# Altium footprint library THU.PcbLib: 477 footprints (part 2 of 30)
Each footprint in its own frame and in the unit in brackets; x right, y up, seen from the top. Pads: shape width x height; smd on the part's side, far side on the other; paste and mask are expansions set on the pad; w line width, h text height; cw(c..) or ccw(c..) is an arc to the next point about the centre after c.
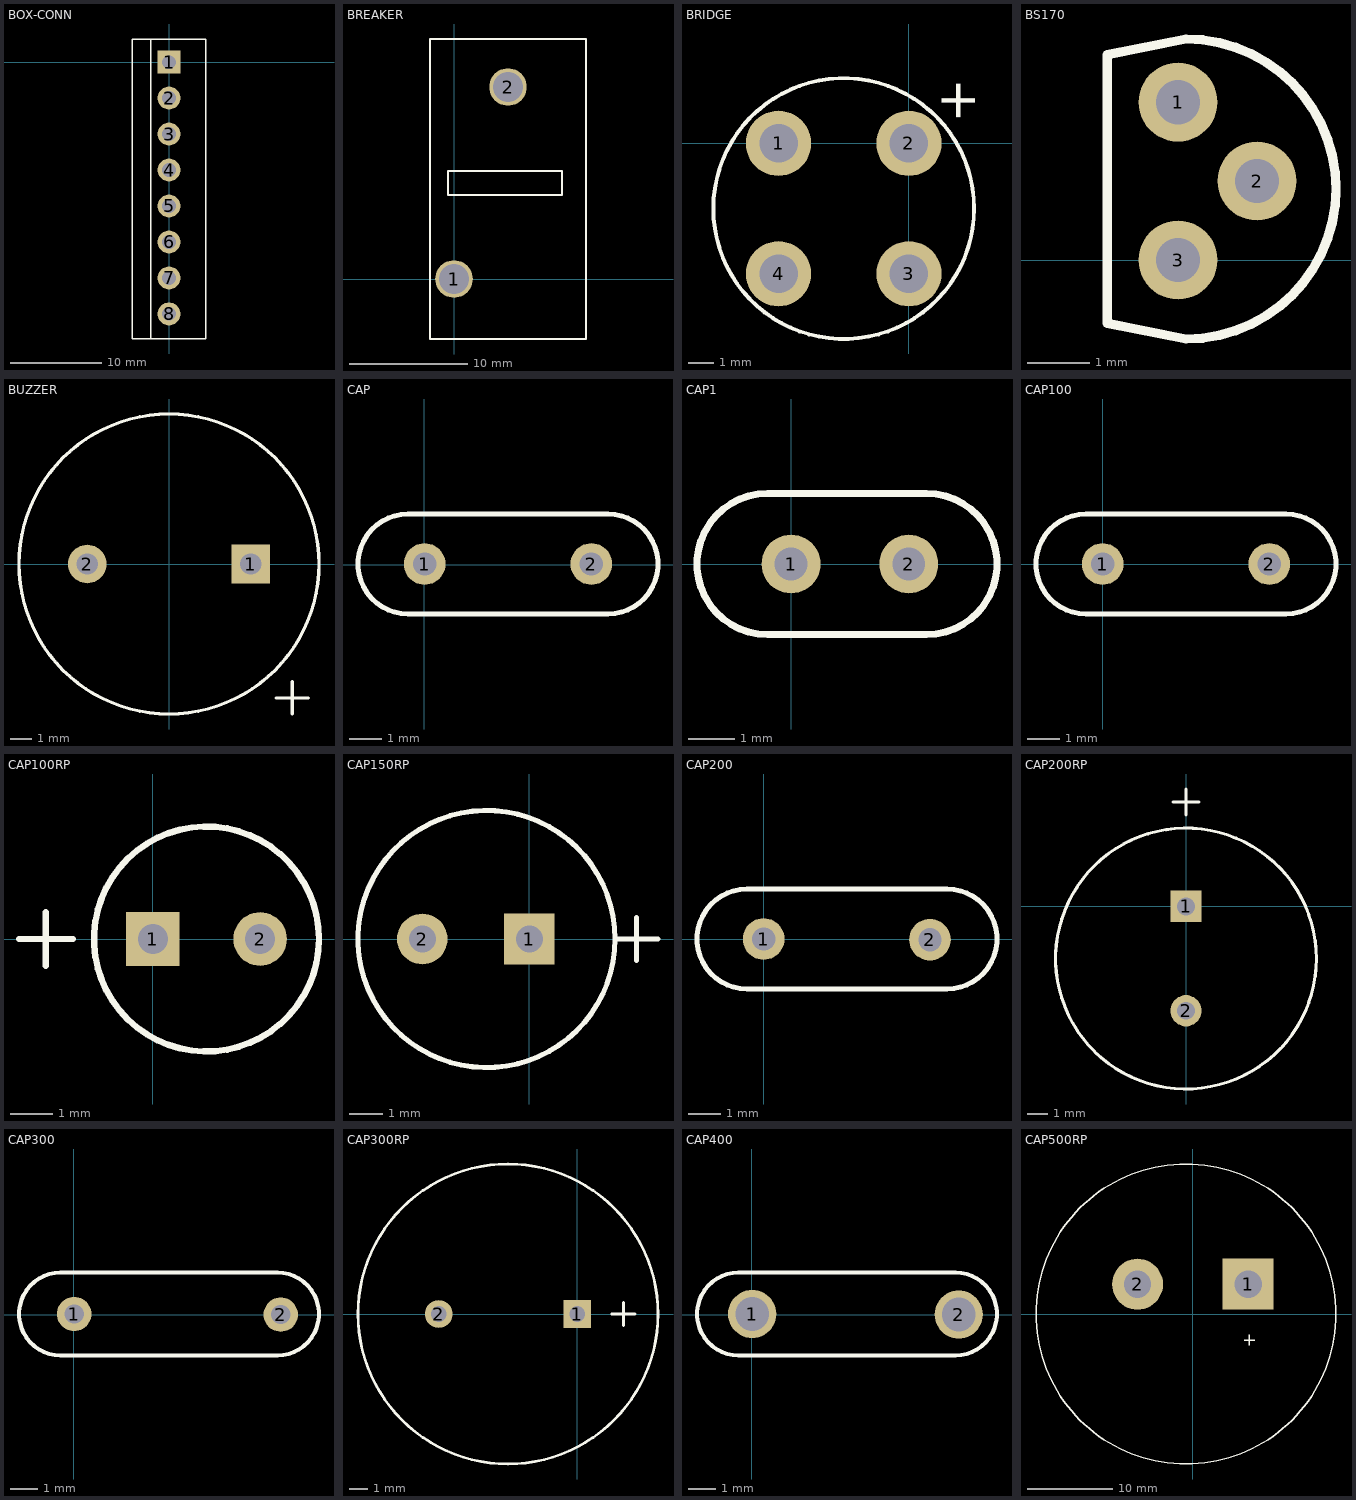
[diagram p1: the footprints below, top view; thin cyan lines are the x and y axes]

## BOX-CONN [mil]
pads (8):
  rect 100x100 hole 59: 1(0,0)
  round 100 hole 59: 2(0,-155.91) 3(0,-311.81) 4(0,-467.72) 5(0,-623.62) 6(0,-779.53) 7(0,-935.43) 8(0,-1091.34)
TopOverlay:
  lines w6: -80,-1200 -80,100 ; -160,-1200 160,-1200 160,100 -160,100 -160,-1200

## BREAKER [mil]
pads (2):
  round 125 hole 100: 1(0,0) 2(180,640)
TopOverlay:
  lines w6: -80,-200 440,-200 440,800 -80,800 -80,-200 ; -20,280 360,280 360,360 -20,360 -20,280

## BRIDGE [mil]
pads (4):
  round 100 hole 59: 1(-200,0) 2(0,0) 3(0,-200) 4(-200,-200)
TopOverlay:
  circle w6: c-100,-100 r200
  text "+" at 50,100 h60

## BS170 [mil]
pads (3):
  round 50 hole 28: 1(-120.08,100) 2(-70.08,50) 3(-120.08,0)
TopOverlay:
  lines w6: -165.08,-40 -115.08,-50 ccw(c-115.08,45) -115.08,140 -165.08,130 -165.08,-40

## BUZZER [mm] "TRANSDUCER/BUZZER"
height 7.45
pads (2):
  rect 1.8x1.8 hole 1: 1(3.81,0)
  round 1.8 hole 1: 2(-3.81,0)
TopOverlay:
  circle w0.152: c0,0 r7
  lines w0.152: 5,-6.25 6.5,-6.25 ; 5.75,-7 5.75,-5.5

## CAP [mil]
pads (2):
  round 50 hole 28: 1(0.5,0.81) 2(200.5,0.81)
TopOverlay:
  lines w6: -19.5,-59.19 cw(c-19.5,0.81) -19.5,60.81 220.5,60.81 cw(c220.5,0.81) 220.5,-59.19 -19.5,-59.19

## CAP1 [mil]
pads (2):
  round 50 hole 28: 1(0,0) 2(100,0)
TopOverlay:
  lines w6: -20,-60 cw(c-20,0) -20,60 115,60 cw(c115,0) 115,-60 -20,-60

## CAP100 [mil]
pads (2):
  round 50 hole 28: 1(0,0) 2(200,0)
TopOverlay:
  lines w6: -20,-60 cw(c-20,0) -20,60 220,60 cw(c220,0) 220,-60 -20,-60

## CAP100RP [mil]
pads (2):
  rect 50x50 hole 28: 1(0,0)
  round 50 hole 28: 2(100,0)
TopOverlay:
  circle w6: c50,0 r105
  lines w6: -125,0 -75,0 ; -100,-25 -100,25

## CAP150RP [mm]
pads (2):
  rect 1.5x1.5 hole 0.8: 1(0,0)
  round 1.5 hole 0.8: 2(-3.175,0)
TopOverlay:
  circle w0.152: c-1.27,0 r3.81
  lines w0.152: 2.54,0 3.81,0 ; 3.175,-0.635 3.175,0.635

## CAP200 [mil]
pads (2):
  round 50 hole 28: 1(0,0) 2(199.5,-0.81)
TopOverlay:
  lines w6: -20,-60 cw(c-20,0) -20,60 220,60 cw(c220,0) 220,-60 -20,-60

## CAP200RP [mil]
pads (2):
  rect 60x60 hole 34: 1(0,0)
  round 60 hole 34: 2(0,-200)
TopOverlay:
  circle w6: c0,-100 r250
  lines w6: -25,200 25,200 ; 0,175 0,225

## CAP300 [mil]
pads (2):
  round 50 hole 28: 1(0.5,0.81) 2(300,0)
TopOverlay:
  lines w6: -19.5,-59.19 cw(c-19.5,0.81) -19.5,60.81 295.5,60.81 cw(c295.5,0.81) 295.5,-59.19 -19.5,-59.19

## CAP300RP [mil]
pads (2):
  rect 60x60 hole 34: 1(0,0)
  round 60 hole 34: 2(-300,0)
TopOverlay:
  circle w6: c-150,0 r325
  lines w6: 75,0 125,0 ; 100,-25 100,25

## CAP400 [mil]
pads (2):
  round 70 hole 49: 1(0.5,0.81) 2(300,0)
TopOverlay:
  lines w6: -19.5,-59.19 cw(c-19.5,0.81) -19.5,60.81 295.5,60.81 cw(c295.5,0.81) 295.5,-59.19 -19.5,-59.19

## CAP500RP [mm]
pads (2):
  rect 6x6 hole 3.2: 1(6.5,3.5)
  round 6 hole 3.2: 2(-6.5,3.5)
TopOverlay:
  circle w0.152: c-0.81,0 r17.64
  lines w0.152: 6.03,-3.075 7.3,-3.075 ; 6.6,-3.7 6.6,-2.43